# Altium footprint library PCB_CONNECTORS.PcbLib: 676 footprints (part 26 of 43) (continued)
## PHOENIX_1777170 [mm] "PCB Header, 12A, 320V, Pitch: 5.08mm, 12 Positions, MSTBV Serie"
height 12
pads (14):
  round 2.1 hole 1.4: 1(-27.94,0) 2(-22.86,0) 3(-17.78,0) 4(-12.7,0) 5(-7.62,0) 6(-2.54,0) 7(2.54,0) 8(7.62,0) 9(12.7,0) 10(17.78,0) 11(22.86,0) 12(27.94,0)
  round 3.8 hole 2.4: P1(-33.02,0) P2(33.02,0)
Top Overlay:
  drawing of 224 lines, arcs and shapes, not listed
  text "12" at 27.407,3.505 h0.75
  text "11" at 22.479,3.505 h0.75
  text "10" at 17.272,3.505 h0.75
  text "9" at 12.497,3.505 h0.75
  text "8" at 7.391,3.505 h0.75
  text "7" at 2.337,3.505 h0.75
  text "6" at -2.743,3.505 h0.75
  text "1" at -28.08,3.505 h0.75
  text "2" at -23.08,3.505 h0.75
  text "3" at -18.009,3.505 h0.75
  text "4" at -12.954,3.505 h0.75
  text "5" at -7.823,3.505 h0.75
Mechanical 8:
  lines w0.1: -33.52,0 -33.02,0 ; -33.02,-0.5 -33.02,0 ; -33.02,0.5 -33.02,0 ; -32.52,0 -33.02,0 ; -28.44,0 -27.94,0 ; -27.94,-0.5 -27.94,0 ; -27.94,0.5 -27.94,0 ; -27.44,0 -27.94,0 ; -23.36,0 -22.86,0 ; -22.86,-0.5 -22.86,0 ; -22.86,0.5 -22.86,0 ; -22.36,0 -22.86,0 ; -18.28,0 -17.78,0 ; -17.78,-0.5 -17.78,0 ; -17.78,0.5 -17.78,0 ; -17.28,0 -17.78,0 ; -13.2,0 -12.7,0 ; -12.7,-0.5 -12.7,0 ; -12.7,0.5 -12.7,0 ; -12.2,0 -12.7,0 ; -8.12,0 -7.62,0 ; -7.62,-0.5 -7.62,0 ; -7.62,0.5 -7.62,0 ; -7.12,0 -7.62,0 ; -3.04,0 -2.54,0 ; -2.54,-0.5 -2.54,0 ; -2.54,0.5 -2.54,0 ; -2.04,0 -2.54,0 ; -0.5,0 0,0 ; 0,-0.5 0,0 ; 0,0.5 0,0 ; 0.5,0 0,0 ; 2.04,0 2.54,0 ; 2.54,-0.5 2.54,0 ; 2.54,0.5 2.54,0 ; 3.04,0 2.54,0 ; 7.12,0 7.62,0 ; 7.62,-0.5 7.62,0 ; 7.62,0.5 7.62,0 ; 8.12,0 7.62,0 ; 12.2,0 12.7,0 ; 12.7,-0.5 12.7,0 ; 12.7,0.5 12.7,0 ; 13.2,0 12.7,0 ; 17.28,0 17.78,0 ; 17.78,-0.5 17.78,0 ; 17.78,0.5 17.78,0 ; 18.28,0 17.78,0 ; 22.36,0 22.86,0 ; 22.86,-0.5 22.86,0 ; 22.86,0.5 22.86,0 ; 23.36,0 22.86,0 ; 27.44,0 27.94,0 ; 27.94,-0.5 27.94,0 ; 27.94,0.5 27.94,0 ; 28.44,0 27.94,0 ; 32.52,0 33.02,0 ; 33.02,-0.5 33.02,0 ; 33.02,0.5 33.02,0 ; 33.52,0 33.02,0
Mechanical 14:
  drawing of 383 lines, arcs and shapes, not listed
  text "5" at -7.823,3.505 h0.75
  text "4" at -12.954,3.505 h0.75
  text "3" at -18.009,3.505 h0.75
  text "2" at -23.08,3.505 h0.75
  text "1" at -28.08,3.505 h0.75
  text "6" at -2.743,3.505 h0.75
  text "7" at 2.337,3.505 h0.75
  text "8" at 7.391,3.505 h0.75
  text "9" at 12.497,3.505 h0.75
  text "10" at 17.272,3.505 h0.75
  text "11" at 22.479,3.505 h0.75
  text "12" at 27.407,3.505 h0.75
3D body "PHOENIX_1777170.stp": height 12, standoff -3.9, extent -35.56,-3.8 35.56,4.8

## PHOENIX_1777222 [mm] "PCB Header, 12A, 320V, Pitch: 5.08mm, 17 Positions, MSTBV Serie"
height 12
pads (19):
  round 2.1 hole 1.4: 1(-40.64,0) 2(-35.56,0) 3(-30.48,0) 4(-25.4,0) 5(-20.32,0) 6(-15.24,0) 7(-10.16,0) 8(-5.08,0) 9(0,0) 10(5.08,0) 11(10.16,0) 12(15.24,0) 13(20.32,0) 14(25.4,0) 15(30.48,0) 16(35.56,0) 17(40.64,0)
  round 3.8 hole 2.4: P1(-45.72,0) P2(45.72,0)
Top Overlay:
  drawing of 314 lines, arcs and shapes, not listed
  text "13" at 19.787,3.505 h0.75
  text "14" at 24.917,3.505 h0.75
  text "15" at 29.972,3.505 h0.75
  text "16" at 35.052,3.505 h0.75
  text "17" at 40.132,3.505 h0.75
  text "12" at 14.707,3.505 h0.75
  text "11" at 9.779,3.505 h0.75
  text "10" at 4.572,3.505 h0.75
  text "9" at -0.203,3.505 h0.75
  text "8" at -5.309,3.505 h0.75
  text "7" at -10.363,3.505 h0.75
  text "6" at -15.443,3.505 h0.75
  text "1" at -40.78,3.505 h0.75
  text "2" at -35.78,3.505 h0.75
  text "3" at -30.709,3.505 h0.75
  text "4" at -25.654,3.505 h0.75
  text "5" at -20.523,3.505 h0.75
Mechanical 8:
  lines w0.1: -46.22,0 -45.72,0 ; -45.72,-0.5 -45.72,0 ; -45.72,0.5 -45.72,0 ; -45.22,0 -45.72,0 ; -41.14,0 -40.64,0 ; -40.64,-0.5 -40.64,0 ; -40.64,0.5 -40.64,0 ; -40.14,0 -40.64,0 ; -36.06,0 -35.56,0 ; -35.56,-0.5 -35.56,0 ; -35.56,0.5 -35.56,0 ; -35.06,0 -35.56,0 ; -30.98,0 -30.48,0 ; -30.48,-0.5 -30.48,0 ; -30.48,0.5 -30.48,0 ; -29.98,0 -30.48,0 ; -25.9,0 -25.4,0 ; -25.4,-0.5 -25.4,0 ; -25.4,0.5 -25.4,0 ; -24.9,0 -25.4,0 ; -20.82,0 -20.32,0 ; -20.32,-0.5 -20.32,0 ; -20.32,0.5 -20.32,0 ; -19.82,0 -20.32,0 ; -15.74,0 -15.24,0 ; -15.24,-0.5 -15.24,0 ; -15.24,0.5 -15.24,0 ; -14.74,0 -15.24,0 ; -13.2,0 -12.7,0 ; -12.7,-0.5 -12.7,0 ; -12.7,0.5 -12.7,0 ; -12.2,0 -12.7,0 ; -10.66,0 -10.16,0 ; -10.16,-0.5 -10.16,0 ; -10.16,0.5 -10.16,0 ; -9.66,0 -10.16,0 ; -5.58,0 -5.08,0 ; -5.08,-0.5 -5.08,0 ; -5.08,0.5 -5.08,0 ; -4.58,0 -5.08,0 ; -0.5,0 0,0 ; 0,-0.5 0,0 ; 0,0.5 0,0 ; 0.5,0 0,0 ; 4.58,0 5.08,0 ; 5.08,-0.5 5.08,0 ; 5.08,0.5 5.08,0 ; 5.58,0 5.08,0 ; 9.66,0 10.16,0 ; 10.16,-0.5 10.16,0 ; 10.16,0.5 10.16,0 ; 10.66,0 10.16,0 ; 14.74,0 15.24,0 ; 15.24,-0.5 15.24,0 ; 15.24,0.5 15.24,0 ; 15.74,0 15.24,0 ; 19.82,0 20.32,0 ; 20.32,-0.5 20.32,0 ; 20.32,0.5 20.32,0 ; 20.82,0 20.32,0 ; 24.9,0 25.4,0 ; 25.4,-0.5 25.4,0 ; 25.4,0.5 25.4,0 ; 25.9,0 25.4,0 ; 29.98,0 30.48,0 ; 30.48,-0.5 30.48,0 ; 30.48,0.5 30.48,0 ; 30.98,0 30.48,0 ; 35.06,0 35.56,0 ; 35.56,-0.5 35.56,0 ; 35.56,0.5 35.56,0 ; 36.06,0 35.56,0 ; 40.14,0 40.64,0 ; 40.64,-0.5 40.64,0 ; 40.64,0.5 40.64,0 ; 41.14,0 40.64,0 ; 45.22,0 45.72,0 ; 45.72,-0.5 45.72,0 ; 45.72,0.5 45.72,0 ; 46.22,0 45.72,0
Mechanical 14:
  drawing of 538 lines, arcs and shapes, not listed
  text "5" at -20.523,3.505 h0.75
  text "4" at -25.654,3.505 h0.75
  text "3" at -30.709,3.505 h0.75
  text "2" at -35.78,3.505 h0.75
  text "1" at -40.78,3.505 h0.75
  text "6" at -15.443,3.505 h0.75
  text "7" at -10.363,3.505 h0.75
  text "8" at -5.309,3.505 h0.75
  text "9" at -0.203,3.505 h0.75
  text "10" at 4.572,3.505 h0.75
  text "11" at 9.779,3.505 h0.75
  text "12" at 14.707,3.505 h0.75
  text "17" at 40.132,3.505 h0.75
  text "16" at 35.052,3.505 h0.75
  text "15" at 29.972,3.505 h0.75
  text "14" at 24.917,3.505 h0.75
  text "13" at 19.787,3.505 h0.75
3D body "PHOENIX_1777222.stp": height 12, standoff -3.9, extent -48.26,-3.8 48.26,4.8

## PHOENIX_1777251 [mm] "PCB Header, 12A, 320V, Pitch: 5.08mm, 20 Positions, MSTBV Serie"
height 12
pads (22):
  round 2.1 hole 1.4: 1(-48.26,0) 2(-43.18,0) 3(-38.1,0) 4(-33.02,0) 5(-27.94,0) 6(-22.86,0) 7(-17.78,0) 8(-12.7,0) 9(-7.62,0) 10(-2.54,0) 11(2.54,0) 12(7.62,0) 13(12.7,0) 14(17.78,0) 15(22.86,0) 16(27.94,0) 17(33.02,0) 18(38.1,0) 19(43.18,0) 20(48.26,0)
  round 3.8 hole 2.4: P1(-53.34,0) P2(53.34,0)
Top Overlay:
  drawing of 368 lines, arcs and shapes, not listed
  text "13" at 12.167,3.505 h0.75
  text "14" at 17.297,3.505 h0.75
  text "15" at 22.352,3.505 h0.75
  text "16" at 27.432,3.505 h0.75
  text "17" at 32.512,3.505 h0.75
  text "12" at 7.087,3.505 h0.75
  text "11" at 2.159,3.505 h0.75
  text "10" at -3.048,3.505 h0.75
  text "9" at -7.823,3.505 h0.75
  text "8" at -12.929,3.505 h0.75
  text "7" at -17.983,3.505 h0.75
  text "6" at -23.063,3.505 h0.75
  text "1" at -48.4,3.505 h0.75
  text "2" at -43.4,3.505 h0.75
  text "3" at -38.329,3.505 h0.75
  text "4" at -33.274,3.505 h0.75
  text "5" at -28.143,3.505 h0.75
  text "18" at 37.567,3.505 h0.75
  text "19" at 42.672,3.505 h0.75
  text "20" at 47.701,3.505 h0.75
Mechanical 8:
  lines w0.1: -53.84,0 -53.34,0 ; -53.34,-0.5 -53.34,0 ; -53.34,0.5 -53.34,0 ; -52.84,0 -53.34,0 ; -48.76,0 -48.26,0 ; -48.26,-0.5 -48.26,0 ; -48.26,0.5 -48.26,0 ; -47.76,0 -48.26,0 ; -43.68,0 -43.18,0 ; -43.18,-0.5 -43.18,0 ; -43.18,0.5 -43.18,0 ; -42.68,0 -43.18,0 ; -38.6,0 -38.1,0 ; -38.1,-0.5 -38.1,0 ; -38.1,0.5 -38.1,0 ; -37.6,0 -38.1,0 ; -33.52,0 -33.02,0 ; -33.02,-0.5 -33.02,0 ; -33.02,0.5 -33.02,0 ; -32.52,0 -33.02,0 ; -28.44,0 -27.94,0 ; -27.94,-0.5 -27.94,0 ; -27.94,0.5 -27.94,0 ; -27.44,0 -27.94,0 ; -23.36,0 -22.86,0 ; -22.86,-0.5 -22.86,0 ; -22.86,0.5 -22.86,0 ; -22.36,0 -22.86,0 ; -20.82,0 -20.32,0 ; -20.32,-0.5 -20.32,0 ; -20.32,0.5 -20.32,0 ; -19.82,0 -20.32,0 ; -18.28,0 -17.78,0 ; -17.78,-0.5 -17.78,0 ; -17.78,0.5 -17.78,0 ; -17.28,0 -17.78,0 ; -13.2,0 -12.7,0 ; -12.7,-0.5 -12.7,0 ; -12.7,0.5 -12.7,0 ; -12.2,0 -12.7,0 ; -8.12,0 -7.62,0 ; -7.62,-0.5 -7.62,0 ; -7.62,0.5 -7.62,0 ; -7.12,0 -7.62,0 ; -3.04,0 -2.54,0 ; -2.54,-0.5 -2.54,0 ; -2.54,0.5 -2.54,0 ; -2.04,0 -2.54,0 ; 2.04,0 2.54,0 ; 2.54,-0.5 2.54,0 ; 2.54,0.5 2.54,0 ; 3.04,0 2.54,0 ; 7.12,0 7.62,0 ; 7.62,-0.5 7.62,0 ; 7.62,0.5 7.62,0 ; 8.12,0 7.62,0 ; 12.2,0 12.7,0 ; 12.7,-0.5 12.7,0 ; 12.7,0.5 12.7,0 ; 13.2,0 12.7,0 ; 17.28,0 17.78,0 ; 17.78,-0.5 17.78,0 ; 17.78,0.5 17.78,0 ; 18.28,0 17.78,0 ; 22.36,0 22.86,0 ; 22.86,-0.5 22.86,0 ; 22.86,0.5 22.86,0 ; 23.36,0 22.86,0 ; 27.44,0 27.94,0 ; 27.94,-0.5 27.94,0 ; 27.94,0.5 27.94,0 ; 28.44,0 27.94,0 ; 32.52,0 33.02,0 ; 33.02,-0.5 33.02,0 ; 33.02,0.5 33.02,0 ; 33.52,0 33.02,0 ; 37.6,0 38.1,0 ; 38.1,-0.5 38.1,0 ; 38.1,0.5 38.1,0 ; 38.6,0 38.1,0 ; 42.68,0 43.18,0 ; 43.18,-0.5 43.18,0 ; 43.18,0.5 43.18,0 ; 43.68,0 43.18,0 ; 47.76,0 48.26,0 ; 48.26,-0.5 48.26,0 ; 48.26,0.5 48.26,0 ; 48.76,0 48.26,0 ; 52.84,0 53.34,0 ; 53.34,-0.5 53.34,0 ; 53.34,0.5 53.34,0 ; 53.84,0 53.34,0
Mechanical 14:
  drawing of 631 lines, arcs and shapes, not listed
  text "20" at 47.701,3.505 h0.75
  text "19" at 42.672,3.505 h0.75
  text "18" at 37.567,3.505 h0.75
  text "5" at -28.143,3.505 h0.75
  text "4" at -33.274,3.505 h0.75
  text "3" at -38.329,3.505 h0.75
  text "2" at -43.4,3.505 h0.75
  text "1" at -48.4,3.505 h0.75
  text "6" at -23.063,3.505 h0.75
  text "7" at -17.983,3.505 h0.75
  text "8" at -12.929,3.505 h0.75
  text "9" at -7.823,3.505 h0.75
  text "10" at -3.048,3.505 h0.75
  text "11" at 2.159,3.505 h0.75
  text "12" at 7.087,3.505 h0.75
  text "17" at 32.512,3.505 h0.75
  text "16" at 27.432,3.505 h0.75
  text "15" at 22.352,3.505 h0.75
  text "14" at 17.297,3.505 h0.75
  text "13" at 12.167,3.505 h0.75
3D body "PHOENIX_1777251.stp": height 12, standoff -3.9, extent -55.88,-3.8 55.88,4.8

## PHOENIX_1791813 [mm] "6A 160V, Terminal Block, Pitch2.54mm, 1 Positions,  Spring Cage Connection (Conductor/PCB connection direction: 90 °)"
height 13.6
pads (2):
  round 1.8 hole 1.1: 1(0,-2.54) 1(0,2.54)
Top Overlay:
  lines w0.2: -1.64,-4.66 -1.5,-4.66 ; -1.64,-3.478 -1.64,-5.66 -1.5,-5.66 ; -1.64,-1.602 -1.64,1.602 ; -1.64,0.64 0.9,0.64 ; -1.64,3.478 -1.64,5.34 0.9,5.34 0.9,3.478 ; -1.298,-2.47 cw(c-0.37,-1.56) -1.32,-2.447 -1.32,-0.673 cw(c-0.37,-1.56) 0.58,-0.673 0.58,-1.377 ; -1.009,-3.36 -1.5,-3.36 -1.5,-7.26 0.3,-7.26 0.3,-3.805 ; -1.002,-1.712 cw(c-0.37,-1.56) 0.205,-1.256 ; 0.3,-5.66 0.9,-5.66 0.9,-3.478 ; 0.3,-4.66 0.9,-4.66 ; 0.9,-1.602 0.9,1.602 ; -1,-6.735 -0.2,-6.735 -0.2,-3.885 -1,-3.885 -1,-6.735
Mechanical 8:
  lines w0.1: -0.5,-2.54 0,-2.54 ; -0.5,0 0,0 ; -0.5,2.54 0,2.54 ; 0,-3.04 0,-2.54 ; 0,-2.04 0,-2.54 ; 0,-0.5 0,0 ; 0,0.5 0,0 ; 0,2.04 0,2.54 ; 0,3.04 0,2.54 ; 0.5,-2.54 0,-2.54 ; 0.5,0 0,0 ; 0.5,2.54 0,2.54
Mechanical 14:
  circle w0.1: c-0.37,-1.56 r0.65
  lines w0.1: -1.641,-4.906 -3.016,-5.041 cw(c-2.995,-4.595) -3.44,-4.634 -3.44,-3.694 cw(c-2.993,-3.735) -3.035,-3.288 -1.641,-3.422 ; -1.641,-0.397 -3.016,-0.533 cw(c-2.995,-0.086) -3.44,-0.126 -3.44,0.815 cw(c-2.993,0.774) -3.035,1.221 -1.641,1.087 ; -1.641,1.598 -3.016,1.463 cw(c-2.995,1.909) -3.44,1.87 -3.44,2.81 cw(c-2.993,2.769) -3.035,3.216 -1.641,3.082 ; -1.64,-4.66 -1.5,-4.66 ; -1.64,0.64 0.9,0.64 ; -1.5,-5.66 -1.64,-5.66 -1.64,5.34 0.9,5.34 0.9,-5.66 0.3,-5.66 ; 0.3,-4.66 0.9,-4.66 ; -1.5,-7.26 0.3,-7.26 0.3,-3.36 -1.5,-3.36 -1.5,-7.26 ; -1.32,-2.447 ccw(c-0.37,-1.56) 0.58,-2.447 0.58,-0.673 ccw(c-0.37,-1.56) -1.32,-0.673 -1.32,-2.447 ; -1,-6.735 -0.2,-6.735 -0.2,-3.885 -1,-3.885 -1,-6.735
3D body "PHOENIX_1791813.stp": height 13.6, standoff -3.4, extent -3.44,-7.26 0.9,5.34

## PHOENIX_1791826 [mm] "6A 160V, Terminal Block, Pitch2.54mm, 1 Positions,  Spring Cage Connection (Conductor/PCB connection direction: 0 °)"
height 12.6
pads (2):
  round 1.8 hole 1.1: 1(0,-2.54) 1(0,2.54)
Top Overlay:
  lines w0.2: -0.9,-3.478 -0.9,-8.04 1.64,-8.04 1.64,-3.478 ; -0.9,-1.602 -0.9,1.602 ; -0.9,-0.29 1.64,-0.29 ; -0.9,3.478 -0.9,5.56 1.64,5.56 1.64,3.478 ; -0.4,-8.017 -0.4,-4.827 0.887,-3.54 ; -0.3,-8.04 -0.3,-6.74 0.9,-5.54 0.9,-3.478 ; 0.9,-1.602 0.9,-1.037 1.5,-1.037 1.5,-1.602 ; 1.5,-8.04 1.5,-3.478 ; 1.64,-1.602 1.64,1.602
Mechanical 8:
  lines w0.1: -0.5,-2.54 0,-2.54 ; -0.5,0 0,0 ; -0.5,2.54 0,2.54 ; 0,-3.04 0,-2.54 ; 0,-2.04 0,-2.54 ; 0,-0.5 0,0 ; 0,0.5 0,0 ; 0,2.04 0,2.54 ; 0,3.04 0,2.54 ; 0.5,-2.54 0,-2.54 ; 0.5,0 0,0 ; 0.5,2.54 0,2.54
Mechanical 14:
  lines w0.1: -0.9,-0.29 1.64,-0.29 ; -0.4,-8.017 -0.4,-4.827 0.887,-3.54 ; -0.3,-8.04 -0.3,-6.74 0.9,-5.54 0.9,-1.037 1.5,-1.037 1.5,-8.04 ; 1.641,-6.082 3.035,-6.216 ccw(c2.993,-5.769) 3.44,-5.81 3.44,-4.87 ccw(c2.995,-4.909) 3.016,-4.463 1.641,-4.598 ; 1.641,1.318 3.035,1.184 ccw(c2.993,1.631) 3.44,1.59 3.44,2.53 ccw(c2.995,2.491) 3.016,2.937 1.641,2.802 ; 1.641,3.518 3.035,3.384 ccw(c2.993,3.831) 3.44,3.79 3.44,4.73 ccw(c2.995,4.691) 3.016,5.137 1.641,5.002 ; -0.9,-8.04 1.64,-8.04 1.64,5.56 -0.9,5.56 -0.9,-8.04
3D body "PHOENIX_1791826.stp": height 12.6, standoff -3.6, extent -0.9,-8.04 3.44,5.56

## PHOENIX_1791855 [mm] "6A 160V, End Terminal Block, Pitch2.54mm, 1 Positions,  Spring Cage Connection (Conductor/PCB connection direction: 90 °)"
height 13.6
pads (2):
  round 1.8 hole 1.1: 1(0,-2.54) 1(0,2.54)
Top Overlay:
  lines w0.2: -4.18,-4.66 -1.5,-4.66 ; -4.18,-3.478 -4.18,-5.66 -1.5,-5.66 ; -4.18,-1.602 -4.18,1.602 ; -4.18,3.478 -4.18,5.34 0.9,5.34 0.9,3.478 ; -1.64,-4.66 -1.64,-3.26 -1.082,-3.26 ; -1.298,-2.47 cw(c-0.37,-1.56) -1.32,-2.447 -1.32,-0.673 cw(c-0.37,-1.56) 0.58,-0.673 0.58,-1.377 ; -1.009,-3.36 -1.5,-3.36 -1.5,-7.26 0.3,-7.26 0.3,-3.805 ; -1.002,-1.712 cw(c-0.37,-1.56) 0.205,-1.256 ; 0.3,-5.66 0.9,-5.66 0.9,-3.478 ; 0.3,-4.66 0.9,-4.66 ; 0.4,-4.66 0.4,-3.777 ; 0.9,-1.602 0.9,1.602 ; -1,-6.735 -0.2,-6.735 -0.2,-3.885 -1,-3.885 -1,-6.735
Mechanical 8:
  lines w0.1: -0.5,-2.54 0,-2.54 ; -0.5,0 0,0 ; -0.5,2.54 0,2.54 ; 0,-3.04 0,-2.54 ; 0,-2.04 0,-2.54 ; 0,-0.5 0,0 ; 0,0.5 0,0 ; 0,2.04 0,2.54 ; 0,3.04 0,2.54 ; 0.5,-2.54 0,-2.54 ; 0.5,0 0,0 ; 0.5,2.54 0,2.54
Mechanical 14:
  circle w0.1: c-0.37,-1.56 r0.65
  lines w0.1: -4.18,-4.66 -1.5,-4.66 ; -1.64,-4.66 -1.64,-3.26 0.4,-3.26 0.4,-4.66 ; -1.5,-5.66 -4.18,-5.66 -4.18,5.34 0.9,5.34 0.9,-5.66 0.3,-5.66 ; 0.3,-4.66 0.9,-4.66 ; -1.5,-7.26 -1.5,-3.36 0.3,-3.36 0.3,-7.26 -1.5,-7.26 ; -1.32,-2.447 ccw(c-0.37,-1.56) 0.58,-2.447 0.58,-0.673 ccw(c-0.37,-1.56) -1.32,-0.673 -1.32,-2.447 ; -1,-6.735 -0.2,-6.735 -0.2,-3.885 -1,-3.885 -1,-6.735
3D body "PHOENIX_1791855.stp": height 13.6, standoff -3.4, extent -4.18,-7.26 0.9,5.34

## PHOENIX_1791868 [mm] "6A 160V, End Terminal Block, Pitch2.54mm, 1 Positions,  Spring Cage Connection (Conductor/PCB connection direction: 0 °)"
height 12.6
pads (2):
  round 1.8 hole 1.1: 1(0,-2.54) 1(0,2.54)
Top Overlay:
  lines w0.2: -0.9,-3.612 -0.9,-8.04 4.18,-8.04 ; -0.9,-1.468 -0.9,1.468 ; -0.9,-0.29 4.18,-0.29 ; -0.9,3.612 -0.9,5.529 ; -0.9,5.56 4.18,5.56 4.18,3.643 ; -0.4,-8.04 -0.4,-4.827 0.643,-3.784 ; -0.3,-8.04 -0.3,-6.74 0.9,-5.54 0.9,-3.612 ; 0.9,-1.468 0.9,-1.037 1.5,-1.037 1.5,-8.04 ; 1.5,-3.54 1.64,-3.54 1.64,-8.04 ; 4.18,-8.009 4.18,-3.582 ; 4.18,-1.437 4.18,1.498
Mechanical 8:
  lines w0.1: -0.5,-2.54 0,-2.54 ; -0.5,0 0,0 ; -0.5,2.54 0,2.54 ; 0,-3.04 0,-2.54 ; 0,-2.04 0,-2.54 ; 0,-0.5 0,0 ; 0,0.5 0,0 ; 0,2.04 0,2.54 ; 0,3.04 0,2.54 ; 0.5,-2.54 0,-2.54 ; 0.5,0 0,0 ; 0.5,2.54 0,2.54
Mechanical 14:
  lines w0.1: -0.9,-0.29 4.18,-0.29 ; -0.9,5.529 -0.9,-8.04 4.18,-8.04 4.18,5.56 -0.9,5.56 ; -0.4,-8.04 -0.4,-4.827 0.887,-3.54 0.9,-3.54 ; -0.3,-8.04 -0.3,-6.74 0.9,-5.54 0.9,-1.037 1.5,-1.037 1.5,-8.04 ; 1.5,-3.54 1.64,-3.54 1.64,-8.04
3D body "PHOENIX_1791868.stp": height 12.6, standoff -3.6, extent -0.9,-8.04 4.18,5.56

## PHOENIX_1792863 [mm] "PHOENIX PTS Serie, Pitch 5mm, 12A, 400V, 2 Positions Header"
height 13.6
pads (2):
  round 1.9 hole 1.2: 1(-2.5,0) 2(2.5,0)
Top Overlay:
  drawing of 294 lines, arcs and shapes, not listed
Mechanical 8:
  lines w0.1: -2.5,0 -3,0 -2.5,0 ; -2.5,0 -2.5,-0.5 -2.5,0 ; -2.5,0 -2,0 -2.5,0 ; -2.5,0 -2.5,0.5 -2.5,0 ; 0,0 -0.5,0 0,0 ; 0,0 0,-0.5 0,0 ; 0,0 0.5,0 0,0 ; 0,0 0,0.5 0,0 ; 2.5,0 2,0 2.5,0 ; 2.5,0 2.5,-0.5 2.5,0 ; 2.5,0 3,0 2.5,0 ; 2.5,0 2.5,0.5 2.5,0
Mechanical 14:
  drawing of 286 lines, arcs and shapes, not listed
3D body "PHOENIX_1792863.stp": height 13.6, standoff -2.49, extent -5,-4.95 5,5.55

## PHOENIX_1792876 [mm] "PHOENIX PTS Serie, Pitch 5mm, 12A, 400V, 3 Positions Header"
height 13.6
pads (3):
  round 1.9 hole 1.2: 1(-5,0) 2(0,0) 3(5,0)
Top Overlay:
  drawing of 437 lines, arcs and shapes, not listed
Mechanical 8:
  lines w0.1: -5.5,0 -5,0 ; -5,-0.5 -5,0 ; -5,0.5 -5,0 ; -4.5,0 -5,0 ; -0.5,0 0,0 ; 0,-0.5 0,0 ; 0,0.5 0,0 ; 0.5,0 0,0 ; 4.5,0 5,0 ; 5,-0.5 5,0 ; 5,0.5 5,0 ; 5.5,0 5,0
Mechanical 14:
  drawing of 425 lines, arcs and shapes, not listed
3D body "PHOENIX_1792876.stp": height 13.6, standoff -2.49, extent -7.5,-4.95 7.5,5.55

## PHOENIX_1803277 [mm] "PHOENIX MC Serie, Pitch 3.81mm, 8A, 160V, 2 Positions Right Angled Header"
height 7.25
pads (2):
  round 1.9 hole 1.2: 1(-1.905,0) 2(1.905,0)
Top Overlay:
  lines w0.2: -4.505,-4.8 4.505,-4.8 ; -4.505,-4.4 4.505,-4.4 ; -2.523,1.2 -4.505,1.2 -4.505,-8 4.505,-8 4.505,1.2 2.523,1.2 ; -1.287,1.2 1.287,1.2 ; -0.201,-7.25 0.2,-7.25 0,-8 -0.201,-7.25
  text "2" at 1.589,-2.35 h1
  text "1" at -1.921,-2.35 h1
Mechanical 8:
  lines w0.1: -2.405,0 -1.905,0 ; -1.905,-0.5 -1.905,0 ; -1.905,0.5 -1.905,0 ; -1.405,0 -1.905,0 ; -0.5,0 0,0 ; 0,-0.5 0,0 ; 0,0.5 0,0 ; 0.5,0 0,0 ; 1.405,0 1.905,0 ; 1.905,-0.5 1.905,0 ; 1.905,0.5 1.905,0 ; 2.405,0 1.905,0
Mechanical 14:
  lines w0.1: -4.505,-4.8 4.505,-4.8 ; -4.505,-4.4 4.505,-4.4 ; -2.17,1.2 cw(c-1.905,0.9) -1.64,1.2 ; 1.64,1.2 cw(c1.905,0.9) 2.17,1.2 ; -4.505,-8 4.505,-8 4.505,1.2 -4.505,1.2 -4.505,-8 ; -0.201,-7.25 0.2,-7.25 0,-8 -0.201,-7.25
3D body "PHOENIX_1803277.stp": height 7.25, standoff -3.4, extent -4.505,-8 4.505,1.3

## PHOENIX_1803426 [mm] "PCB Header, 8A, 160 V, Pitch: 3.81mm, 2 Positions, MCV Serie"
height 9.2
pads (2):
  round 1.9 hole 1.2: 1(-1.905,0) 2(1.905,0)
Top Overlay:
  lines w0.2: -4.505,4 4.505,4 ; -3.61,-2.3 -2.805,-2.3 ; -3.61,2 -2.305,2 -2.305,2.47 ccw(c-2.505,2.47) -2.505,2.67 ; -3.608,3.9 -3.609,3.9 ; -3.608,4 -3.609,4 -3.609,3.9 ; -2.305,2.134 -3.61,2.134 -3.61,-2.434 -2.759,-2.434 ; -1.505,2.134 -0.2,2.134 -0.2,-2.434 -1.051,-2.434 ; -1.305,2.67 ccw(c-1.305,2.47) -1.505,2.47 -1.505,2 -0.2,2 ; -0.201,4 -0.2,4 -0.2,3.9 -0.201,3.9 -3.609,3.9 ; -0.2,-2.3 -1.005,-2.3 ; 0.2,-2.3 1.005,-2.3 ; 0.2,2 1.505,2 1.505,2.47 ccw(c1.305,2.47) 1.305,2.67 ; 0.202,3.9 0.201,3.9 ; 0.202,4 0.201,4 0.201,3.9 ; 1.505,2.134 0.2,2.134 0.2,-2.434 1.051,-2.434 ; 2.305,2.134 3.61,2.134 3.61,-2.434 2.759,-2.434 ; 2.505,2.67 ccw(c2.505,2.47) 2.305,2.47 2.305,2 3.61,2 ; 3.609,4 3.61,4 3.61,3.9 3.609,3.9 0.201,3.9 ; 3.61,-2.3 2.805,-2.3 ; -2.805,-2.3 cw(c-1.905,-3.5) -1.005,-2.3 ; -2.805,-2.3 -2.794,-2.334 -2.782,-2.367 ccw(c5.266,0.384) -2.759,-2.434 ; -2.759,-2.434 cw(c-1.905,-3.5) -1.051,-2.434 ; -1.051,-2.434 -1.039,-2.401 -1.028,-2.367 ccw(c-9.737,0.61) -1.005,-2.3 ; 1.005,-2.3 cw(c1.905,-3.5) 2.805,-2.3 ; 1.005,-2.3 1.016,-2.334 1.028,-2.367 ccw(c9.076,0.384) 1.051,-2.434 ; 1.051,-2.434 cw(c1.905,-3.5) 2.759,-2.434 ; 2.759,-2.434 2.771,-2.401 2.782,-2.367 ccw(c-5.927,0.61) 2.805,-2.3 ; -4.505,-3 -4.505,4.25 4.505,4.25 4.505,-3 -4.505,-3 ; -3.395,3.35 -3.16,2.67 -0.65,2.67 -0.415,3.35 -3.395,3.35 ; -0.188,-0.7 0,0 0.188,-0.7 -0.188,-0.7 ; 0.415,3.35 0.65,2.67 3.16,2.67 3.395,3.35 0.415,3.35
  text "2" at 1.63,4.6 h1
  text "1" at -2.18,4.6 h1
Mechanical 8:
  lines w0.1: -2.405,0 -1.905,0 ; -1.905,-0.5 -1.905,0 ; -1.905,0.5 -1.905,0 ; -1.405,0 -1.905,0 ; -0.5,0 0,0 ; 0,-0.5 0,0 ; 0,0.5 0,0 ; 0.5,0 0,0 ; 1.405,0 1.905,0 ; 1.905,-0.5 1.905,0 ; 1.905,0.5 1.905,0 ; 2.405,0 1.905,0
Mechanical 14:
  lines w0.1: -4.505,4 4.505,4 ; -3.61,-2.3 -2.805,-2.3 ; -3.61,2 -2.305,2 -2.305,2.47 ccw(c-2.505,2.47) -2.505,2.67 ; -3.608,3.9 -3.609,3.9 ; -3.608,4 -3.609,4 -3.609,3.9 ; -2.305,2.134 -3.61,2.134 -3.61,-2.434 -2.759,-2.434 ; -1.505,2.134 -0.2,2.134 -0.2,-2.434 -1.051,-2.434 ; -1.305,2.67 ccw(c-1.305,2.47) -1.505,2.47 -1.505,2 -0.2,2 ; -0.201,4 -0.2,4 -0.2,3.9 -0.201,3.9 -3.609,3.9 ; -0.2,-2.3 -1.005,-2.3 ; 0.2,-2.3 1.005,-2.3 ; 0.2,2 1.505,2 1.505,2.47 ccw(c1.305,2.47) 1.305,2.67 ; 0.202,3.9 0.201,3.9 ; 0.202,4 0.201,4 0.201,3.9 ; 1.505,2.134 0.2,2.134 0.2,-2.434 1.051,-2.434 ; 2.305,2.134 3.61,2.134 3.61,-2.434 2.759,-2.434 ; 2.505,2.67 ccw(c2.505,2.47) 2.305,2.47 2.305,2 3.61,2 ; 3.609,4 3.61,4 3.61,3.9 3.609,3.9 0.201,3.9 ; 3.61,-2.3 2.805,-2.3 ; -2.805,-2.3 cw(c-1.905,-3.5) -1.005,-2.3 ; -2.805,-2.3 -2.794,-2.334 -2.782,-2.367 ccw(c5.266,0.384) -2.759,-2.434 ; -2.759,-2.434 cw(c-1.905,-3.5) -1.051,-2.434 ; -1.051,-2.434 -1.039,-2.401 -1.028,-2.367 ccw(c-9.737,0.61) -1.005,-2.3 ; 1.005,-2.3 cw(c1.905,-3.5) 2.805,-2.3 ; 1.005,-2.3 1.016,-2.334 1.028,-2.367 ccw(c9.076,0.384) 1.051,-2.434 ; 1.051,-2.434 cw(c1.905,-3.5) 2.759,-2.434 ; 2.759,-2.434 2.771,-2.401 2.782,-2.367 ccw(c-5.927,0.61) 2.805,-2.3 ; -4.505,-3 -4.505,4.25 4.505,4.25 4.505,-3 -4.505,-3 ; -3.395,3.35 -3.16,2.67 -0.65,2.67 -0.415,3.35 -3.395,3.35 ; -2.405,-0.625 ccw(c-1.905,0) -2.405,0.625 -2.405,-0.624 ; -2.305,-0.4 -1.505,-0.4 -1.505,0.4 -2.305,0.4 -2.305,-0.4 ; -0.188,-0.7 0,0 0.188,-0.7 -0.188,-0.7 ; 0.415,3.35 0.65,2.67 3.16,2.67 3.395,3.35 0.415,3.35 ; 1.405,-0.625 ccw(c1.905,0) 1.405,0.625 1.405,-0.624 ; 1.505,-0.4 2.305,-0.4 2.305,0.4 1.505,0.4 1.505,-0.4
3D body "PHOENIX_1803426.stp": height 9.2, standoff -3.4, extent -4.505,-3 4.505,4.25

## PHOENIX_1803426 - duplicate [mm] "PCB Header, 8A, 160 V, Pitch: 3.81mm, 2 Positions, MCV Serie"
height 9.2
pads (2):
  round 1.9 hole 1.2: 1(-1.905,0) 2(1.905,0)
Top Overlay:
  lines w0.2: -4.505,4 4.505,4 ; -3.61,-2.3 -2.805,-2.3 ; -3.61,2 -2.305,2 -2.305,2.47 ccw(c-2.505,2.47) -2.505,2.67 ; -3.608,3.9 -3.609,3.9 ; -3.608,4 -3.609,4 -3.609,3.9 ; -2.305,2.134 -3.61,2.134 -3.61,-2.434 -2.759,-2.434 ; -1.505,2.134 -0.2,2.134 -0.2,-2.434 -1.051,-2.434 ; -1.305,2.67 ccw(c-1.305,2.47) -1.505,2.47 -1.505,2 -0.2,2 ; -0.201,4 -0.2,4 -0.2,3.9 -0.201,3.9 -3.609,3.9 ; -0.2,-2.3 -1.005,-2.3 ; 0.2,-2.3 1.005,-2.3 ; 0.2,2 1.505,2 1.505,2.47 ccw(c1.305,2.47) 1.305,2.67 ; 0.202,3.9 0.201,3.9 ; 0.202,4 0.201,4 0.201,3.9 ; 1.505,2.134 0.2,2.134 0.2,-2.434 1.051,-2.434 ; 2.305,2.134 3.61,2.134 3.61,-2.434 2.759,-2.434 ; 2.505,2.67 ccw(c2.505,2.47) 2.305,2.47 2.305,2 3.61,2 ; 3.609,4 3.61,4 3.61,3.9 3.609,3.9 0.201,3.9 ; 3.61,-2.3 2.805,-2.3 ; -2.805,-2.3 cw(c-1.905,-3.5) -1.005,-2.3 ; -2.805,-2.3 -2.794,-2.334 -2.782,-2.367 ccw(c5.266,0.384) -2.759,-2.434 ; -2.759,-2.434 cw(c-1.905,-3.5) -1.051,-2.434 ; -1.051,-2.434 -1.039,-2.401 -1.028,-2.367 ccw(c-9.737,0.61) -1.005,-2.3 ; 1.005,-2.3 cw(c1.905,-3.5) 2.805,-2.3 ; 1.005,-2.3 1.016,-2.334 1.028,-2.367 ccw(c9.076,0.384) 1.051,-2.434 ; 1.051,-2.434 cw(c1.905,-3.5) 2.759,-2.434 ; 2.759,-2.434 2.771,-2.401 2.782,-2.367 ccw(c-5.927,0.61) 2.805,-2.3 ; -4.505,-3 -4.505,4.25 4.505,4.25 4.505,-3 -4.505,-3 ; -3.395,3.35 -3.16,2.67 -0.65,2.67 -0.415,3.35 -3.395,3.35 ; -0.188,-0.7 0,0 0.188,-0.7 -0.188,-0.7 ; 0.415,3.35 0.65,2.67 3.16,2.67 3.395,3.35 0.415,3.35
  text "2" at 1.63,4.6 h1
  text "1" at -2.18,4.6 h1
Mechanical 8:
  lines w0.1: -2.405,0 -1.905,0 ; -1.905,-0.5 -1.905,0 ; -1.905,0.5 -1.905,0 ; -1.405,0 -1.905,0 ; -0.5,0 0,0 ; 0,-0.5 0,0 ; 0,0.5 0,0 ; 0.5,0 0,0 ; 1.405,0 1.905,0 ; 1.905,-0.5 1.905,0 ; 1.905,0.5 1.905,0 ; 2.405,0 1.905,0
Mechanical 14:
  lines w0.1: -4.505,4 4.505,4 ; -3.61,-2.3 -2.805,-2.3 ; -3.61,2 -2.305,2 -2.305,2.47 ccw(c-2.505,2.47) -2.505,2.67 ; -3.608,3.9 -3.609,3.9 ; -3.608,4 -3.609,4 -3.609,3.9 ; -2.305,2.134 -3.61,2.134 -3.61,-2.434 -2.759,-2.434 ; -1.505,2.134 -0.2,2.134 -0.2,-2.434 -1.051,-2.434 ; -1.305,2.67 ccw(c-1.305,2.47) -1.505,2.47 -1.505,2 -0.2,2 ; -0.201,4 -0.2,4 -0.2,3.9 -0.201,3.9 -3.609,3.9 ; -0.2,-2.3 -1.005,-2.3 ; 0.2,-2.3 1.005,-2.3 ; 0.2,2 1.505,2 1.505,2.47 ccw(c1.305,2.47) 1.305,2.67 ; 0.202,3.9 0.201,3.9 ; 0.202,4 0.201,4 0.201,3.9 ; 1.505,2.134 0.2,2.134 0.2,-2.434 1.051,-2.434 ; 2.305,2.134 3.61,2.134 3.61,-2.434 2.759,-2.434 ; 2.505,2.67 ccw(c2.505,2.47) 2.305,2.47 2.305,2 3.61,2 ; 3.609,4 3.61,4 3.61,3.9 3.609,3.9 0.201,3.9 ; 3.61,-2.3 2.805,-2.3 ; -2.805,-2.3 cw(c-1.905,-3.5) -1.005,-2.3 ; -2.805,-2.3 -2.794,-2.334 -2.782,-2.367 ccw(c5.266,0.384) -2.759,-2.434 ; -2.759,-2.434 cw(c-1.905,-3.5) -1.051,-2.434 ; -1.051,-2.434 -1.039,-2.401 -1.028,-2.367 ccw(c-9.737,0.61) -1.005,-2.3 ; 1.005,-2.3 cw(c1.905,-3.5) 2.805,-2.3 ; 1.005,-2.3 1.016,-2.334 1.028,-2.367 ccw(c9.076,0.384) 1.051,-2.434 ; 1.051,-2.434 cw(c1.905,-3.5) 2.759,-2.434 ; 2.759,-2.434 2.771,-2.401 2.782,-2.367 ccw(c-5.927,0.61) 2.805,-2.3 ; -4.505,-3 -4.505,4.25 4.505,4.25 4.505,-3 -4.505,-3 ; -3.395,3.35 -3.16,2.67 -0.65,2.67 -0.415,3.35 -3.395,3.35 ; -2.405,-0.625 ccw(c-1.905,0) -2.405,0.625 -2.405,-0.624 ; -2.305,-0.4 -1.505,-0.4 -1.505,0.4 -2.305,0.4 -2.305,-0.4 ; -0.188,-0.7 0,0 0.188,-0.7 -0.188,-0.7 ; 0.415,3.35 0.65,2.67 3.16,2.67 3.395,3.35 0.415,3.35 ; 1.405,-0.625 ccw(c1.905,0) 1.405,0.625 1.405,-0.624 ; 1.505,-0.4 2.305,-0.4 2.305,0.4 1.505,0.4 1.505,-0.4
3D body "PHOENIX_1803426.stp": height 9.2, standoff -3.4, extent -4.505,-3 4.505,4.25